# Altium footprint library con-molex.PCBLIB: 368 footprints (part 7 of 26)
Each footprint in its own frame and in the unit in brackets; x right, y up, seen from the top. Pads: shape width x height; smd on the part's side, far side on the other; paste and mask are expansions set on the pad; w line width, h text height; cw(c..) or ccw(c..) is an arc to the next point about the centre after c.
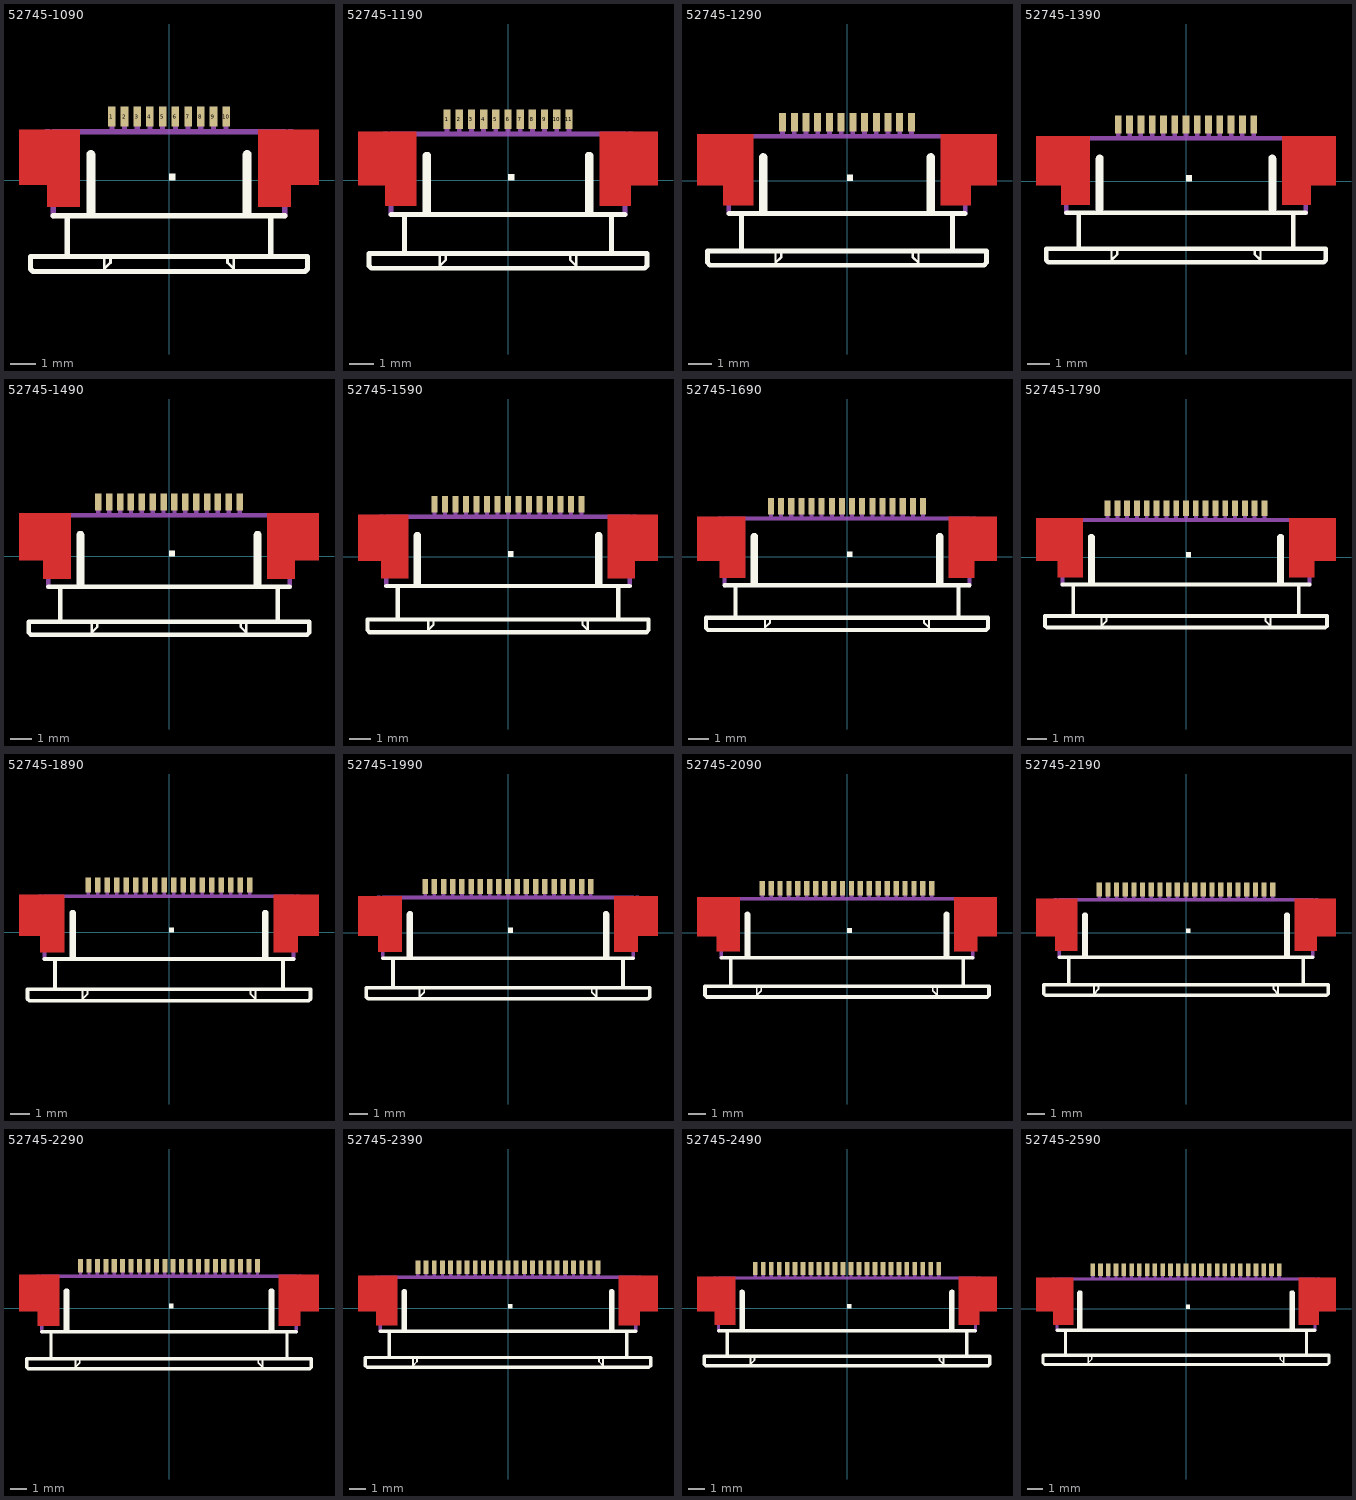
[diagram p6: the footprints below, top view; thin cyan lines are the x and y axes]

## 52745-1090 [mil]
pads (10):
  rect 11.81x31.5 smd: 1(-88.58,98.43) 2(-68.9,98.43) 3(-49.21,98.43) 4(-29.53,98.43) 5(-9.84,98.43) 6(9.84,98.43) 7(29.53,98.43) 8(49.21,98.43) 9(68.9,98.43) 10(88.58,98.43)
Top Layer:
  rectangle: -232.28,-7.87 -137.8,78.74
  rectangle: -188.98,-41.34 -137.8,-7.87
  rectangle: 137.8,-41.34 188.98,-7.87
  rectangle: 137.8,-7.87 232.28,78.74
Top Overlay:
  region: 0,0 10,0 10,10 0,10
  lines w4: -100.39,-122.05 -100.39,-137.8 -90.55,-127.95 -90.55,-122.05 ; 90.55,-122.05 90.55,-127.95 100.39,-137.8 100.39,-122.05
  lines w8: -179.13,-55.12 179.13,-55.12 ; -157.48,-114.17 -157.48,-59.06 ; -124.02,-49.21 -124.02,39.37 cw(c-121.06,39.37) -118.11,39.37 -118.11,-49.21 ; 118.11,-49.21 118.11,39.37 cw(c121.06,39.37) 124.02,39.37 124.02,-49.21 ; 157.48,-114.17 157.48,-59.06 ; -214.57,-137.8 -214.57,-118.11 214.57,-118.11 214.57,-137.8 210.63,-141.73 -210.63,-141.73 -214.57,-137.8
Top Paste:
  region: 224.41,72.83 145.67,72.83 145.67,-1.97 224.41,-1.97
  rectangle: -224.41,-1.97 -145.67,72.83
Top Solder:
  region: 232.28,78.74 187.01,78.74 187.01,-7.87 232.28,-7.87
  region: 188.98,78.74 137.8,78.74 137.8,-41.34 188.98,-41.34
  rectangle: -232.28,-7.87 -187.01,78.74
  rectangle: -188.98,-41.34 -137.8,78.74
Mechanical 16:
  rectangle: -92.52,78.74 -84.65,106.3
  rectangle: -72.83,78.74 -64.96,106.3
  rectangle: -53.15,78.74 -45.28,106.3
  rectangle: -33.46,78.74 -25.59,106.3
  rectangle: -13.78,78.74 -5.91,106.3
  rectangle: 5.91,78.74 13.78,106.3
  rectangle: 25.59,78.74 33.46,106.3
  rectangle: 45.28,78.74 53.15,106.3
  rectangle: 64.96,78.74 72.83,106.3
  rectangle: 84.65,78.74 92.52,106.3
  lines w4: -185.04,74.8 -185.04,27.56 -214.57,27.56 -214.57,35.43 -192.91,35.43 -190.94,37.4 -190.94,57.09 -214.57,57.09 -214.57,64.96 -190.94,64.96 -190.94,76.77 -185.04,76.77 ; 185.04,74.8 185.04,27.56 214.57,27.56 214.57,35.43 192.91,35.43 190.94,37.4 190.94,57.09 214.57,57.09 214.57,64.96 190.94,64.96 190.94,76.77 185.04,76.77
  lines w8: -179.13,-55.12 -179.13,74.8 179.13,74.8 179.13,-55.12

## 52745-1190 [mil]
pads (11):
  rect 11.81x31.5 smd: 1(-98.43,98.43) 2(-78.74,98.43) 3(-59.06,98.43) 4(-39.37,98.43) 5(-19.69,98.43) 6(0,98.43) 7(19.69,98.43) 8(39.37,98.43) 9(59.06,98.43) 10(78.74,98.43) 11(98.43,98.43)
Top Layer:
  rectangle: -242.13,-7.87 -147.64,78.74
  rectangle: -198.82,-41.34 -147.64,-7.87
  rectangle: 147.64,-41.34 198.82,-7.87
  rectangle: 147.64,-7.87 242.13,78.74
Top Overlay:
  region: 0,0 10,0 10,10 0,10
  lines w4: -110.24,-122.05 -110.24,-137.8 -100.39,-127.95 -100.39,-122.05 ; 100.39,-122.05 100.39,-127.95 110.24,-137.8 110.24,-122.05
  lines w8: -188.98,-55.12 188.98,-55.12 ; -167.32,-114.17 -167.32,-59.06 ; -133.86,-49.21 -133.86,39.37 cw(c-130.91,39.37) -127.95,39.37 -127.95,-49.21 ; 127.95,-49.21 127.95,39.37 cw(c130.91,39.37) 133.86,39.37 133.86,-49.21 ; 167.32,-114.17 167.32,-59.06 ; -224.41,-137.8 -224.41,-118.11 224.41,-118.11 224.41,-137.8 220.47,-141.73 -220.47,-141.73 -224.41,-137.8
Top Paste:
  region: 234.25,72.83 155.51,72.83 155.51,-1.97 234.25,-1.97
  rectangle: -234.25,-1.97 -155.51,72.83
Top Solder:
  region: 242.13,78.74 196.85,78.74 196.85,-7.87 242.13,-7.87
  region: 198.82,78.74 147.64,78.74 147.64,-41.34 198.82,-41.34
  rectangle: -242.13,-7.87 -196.85,78.74
  rectangle: -198.82,-41.34 -147.64,78.74
Mechanical 16:
  rectangle: -102.36,78.74 -94.49,106.3
  rectangle: -82.68,78.74 -74.8,106.3
  rectangle: -62.99,78.74 -55.12,106.3
  rectangle: -43.31,78.74 -35.43,106.3
  rectangle: -23.62,78.74 -15.75,106.3
  rectangle: -3.94,78.74 3.94,106.3
  rectangle: 15.75,78.74 23.62,106.3
  rectangle: 35.43,78.74 43.31,106.3
  rectangle: 55.12,78.74 62.99,106.3
  rectangle: 74.8,78.74 82.68,106.3
  rectangle: 94.49,78.74 102.36,106.3
  lines w4: -194.88,74.8 -194.88,27.56 -224.41,27.56 -224.41,35.43 -202.76,35.43 -200.79,37.4 -200.79,57.09 -224.41,57.09 -224.41,64.96 -200.79,64.96 -200.79,76.77 -194.88,76.77 ; 194.88,74.8 194.88,27.56 224.41,27.56 224.41,35.43 202.76,35.43 200.79,37.4 200.79,57.09 224.41,57.09 224.41,64.96 200.79,64.96 200.79,76.77 194.88,76.77
  lines w8: -188.98,-55.12 -188.98,74.8 188.98,74.8 188.98,-55.12

## 52745-1290 [mil]
pads (12):
  rect 11.81x31.5 smd: 1(-108.27,98.43) 2(-88.58,98.43) 3(-68.9,98.43) 4(-49.21,98.43) 5(-29.53,98.43) 6(-9.84,98.43) 7(9.84,98.43) 8(29.53,98.43) 9(49.21,98.43) 10(68.9,98.43) 11(88.58,98.43) 12(108.27,98.43)
Top Layer:
  rectangle: -251.97,-7.87 -157.48,78.74
  rectangle: -208.66,-41.34 -157.48,-7.87
  rectangle: 157.48,-7.87 251.97,78.74
  rectangle: 157.48,-41.34 208.66,-7.87
Top Overlay:
  region: 0,0 10,0 10,10 0,10
  lines w4: -120.08,-122.05 -120.08,-137.8 -110.24,-127.95 -110.24,-122.05 ; 110.24,-122.05 110.24,-127.95 120.08,-137.8 120.08,-122.05
  lines w8: -198.82,-55.12 198.82,-55.12 ; -177.17,-114.17 -177.17,-59.06 ; -143.7,-49.21 -143.7,39.37 cw(c-140.75,39.37) -137.8,39.37 -137.8,-49.21 ; 137.8,-49.21 137.8,39.37 cw(c140.75,39.37) 143.7,39.37 143.7,-49.21 ; 177.17,-114.17 177.17,-59.06 ; -234.25,-137.8 -234.25,-118.11 234.25,-118.11 234.25,-137.8 230.32,-141.73 -230.32,-141.73 -234.25,-137.8
Top Paste:
  region: 244.09,72.83 165.35,72.83 165.35,-1.97 244.09,-1.97
  rectangle: -244.09,-1.97 -165.35,72.83
Top Solder:
  region: 251.97,78.74 206.69,78.74 206.69,-7.87 251.97,-7.87
  region: 208.66,78.74 157.48,78.74 157.48,-41.34 208.66,-41.34
  rectangle: -251.97,-7.87 -206.69,78.74
  rectangle: -208.66,-41.34 -157.48,78.74
Mechanical 16:
  rectangle: -112.2,78.74 -104.33,106.3
  rectangle: -92.52,78.74 -84.65,106.3
  rectangle: -72.83,78.74 -64.96,106.3
  rectangle: -53.15,78.74 -45.28,106.3
  rectangle: -33.46,78.74 -25.59,106.3
  rectangle: -13.78,78.74 -5.91,106.3
  rectangle: 5.91,78.74 13.78,106.3
  rectangle: 25.59,78.74 33.46,106.3
  rectangle: 45.28,78.74 53.15,106.3
  rectangle: 64.96,78.74 72.83,106.3
  rectangle: 84.65,78.74 92.52,106.3
  rectangle: 104.33,78.74 112.2,106.3
  lines w4: -204.72,74.8 -204.72,27.56 -234.25,27.56 -234.25,35.43 -212.6,35.43 -210.63,37.4 -210.63,57.09 -234.25,57.09 -234.25,64.96 -210.63,64.96 -210.63,76.77 -204.72,76.77 ; 204.72,74.8 204.72,27.56 234.25,27.56 234.25,35.43 212.6,35.43 210.63,37.4 210.63,57.09 234.25,57.09 234.25,64.96 210.63,64.96 210.63,76.77 204.72,76.77
  lines w8: -198.82,-55.12 -198.82,74.8 198.82,74.8 198.82,-55.12

## 52745-1390 [mil]
pads (13):
  rect 11.81x31.5 smd: 1(-118.11,98.43) 2(-98.43,98.43) 3(-78.74,98.43) 4(-59.06,98.43) 5(-39.37,98.43) 6(-19.69,98.43) 7(0,98.43) 8(19.69,98.43) 9(39.37,98.43) 10(59.06,98.43) 11(78.74,98.43) 12(98.43,98.43) 13(118.11,98.43)
Top Layer:
  rectangle: -261.81,-7.87 -167.32,78.74
  rectangle: -218.5,-41.34 -167.32,-7.87
  rectangle: 167.32,-7.87 261.81,78.74
  rectangle: 167.32,-41.34 218.5,-7.87
Top Overlay:
  region: 0,0 10,0 10,10 0,10
  lines w4: -129.92,-122.05 -129.92,-137.8 -120.08,-127.95 -120.08,-122.05 ; 120.08,-122.05 120.08,-127.95 129.92,-137.8 129.92,-122.05
  lines w8: -208.66,-55.12 208.66,-55.12 ; -187.01,-114.17 -187.01,-59.06 ; -153.54,-49.21 -153.54,39.37 cw(c-150.59,39.37) -147.64,39.37 -147.64,-49.21 ; 147.64,-49.21 147.64,39.37 cw(c150.59,39.37) 153.54,39.37 153.54,-49.21 ; 187.01,-114.17 187.01,-59.06 ; -244.09,-137.8 -244.09,-118.11 244.09,-118.11 244.09,-137.8 240.16,-141.73 -240.16,-141.73 -244.09,-137.8
Top Paste:
  region: 253.94,72.83 175.2,72.83 175.2,-1.97 253.94,-1.97
  rectangle: -253.94,-1.97 -175.2,72.83
Top Solder:
  region: 261.81,78.74 216.54,78.74 216.54,-7.87 261.81,-7.87
  region: 218.5,78.74 167.32,78.74 167.32,-41.34 218.5,-41.34
  rectangle: -261.81,-7.87 -216.54,78.74
  rectangle: -218.5,-41.34 -167.32,78.74
Mechanical 16:
  rectangle: -122.05,78.74 -114.17,106.3
  rectangle: -102.36,78.74 -94.49,106.3
  rectangle: -82.68,78.74 -74.8,106.3
  rectangle: -62.99,78.74 -55.12,106.3
  rectangle: -43.31,78.74 -35.43,106.3
  rectangle: -23.62,78.74 -15.75,106.3
  rectangle: -3.94,78.74 3.94,106.3
  rectangle: 15.75,78.74 23.62,106.3
  rectangle: 35.43,78.74 43.31,106.3
  rectangle: 55.12,78.74 62.99,106.3
  rectangle: 74.8,78.74 82.68,106.3
  rectangle: 94.49,78.74 102.36,106.3
  rectangle: 114.17,78.74 122.05,106.3
  lines w4: -214.57,74.8 -214.57,27.56 -244.09,27.56 -244.09,35.43 -222.44,35.43 -220.47,37.4 -220.47,57.09 -244.09,57.09 -244.09,64.96 -220.47,64.96 -220.47,76.77 -214.57,76.77 ; 214.57,74.8 214.57,27.56 244.09,27.56 244.09,35.43 222.44,35.43 220.47,37.4 220.47,57.09 244.09,57.09 244.09,64.96 220.47,64.96 220.47,76.77 214.57,76.77
  lines w8: -208.66,-55.12 -208.66,74.8 208.66,74.8 208.66,-55.12

## 52745-1490 [mil]
pads (14):
  rect 11.81x31.5 smd: 1(-127.95,98.43) 2(-108.27,98.43) 3(-88.58,98.43) 4(-68.9,98.43) 5(-49.21,98.43) 6(-29.53,98.43) 7(-9.84,98.43) 8(9.84,98.43) 9(29.53,98.43) 10(49.21,98.43) 11(68.9,98.43) 12(88.58,98.43) 13(108.27,98.43) 14(127.95,98.43)
Top Layer:
  rectangle: -271.65,-7.87 -177.17,78.74
  rectangle: -228.35,-41.34 -177.17,-7.87
  rectangle: 177.17,-7.87 271.65,78.74
  rectangle: 177.17,-41.34 228.35,-7.87
Top Overlay:
  region: 0,0 10,0 10,10 0,10
  lines w4: -139.76,-122.05 -139.76,-137.8 -129.92,-127.95 -129.92,-122.05 ; 129.92,-122.05 129.92,-127.95 139.76,-137.8 139.76,-122.05
  lines w8: -218.5,-55.12 218.5,-55.12 ; -196.85,-114.17 -196.85,-59.06 ; -163.39,-49.21 -163.39,39.37 cw(c-160.44,39.37) -157.48,39.37 -157.48,-49.21 ; 157.48,-49.21 157.48,39.37 cw(c160.44,39.37) 163.39,39.37 163.39,-49.21 ; 196.85,-114.17 196.85,-59.06 ; -253.94,-137.8 -253.94,-118.11 253.94,-118.11 253.94,-137.8 250,-141.73 -250,-141.73 -253.94,-137.8
Top Paste:
  region: 263.78,72.83 185.04,72.83 185.04,-1.97 263.78,-1.97
  rectangle: -263.78,-1.97 -185.04,72.83
Top Solder:
  region: 271.65,78.74 226.38,78.74 226.38,-7.87 271.65,-7.87
  region: 228.35,78.74 177.17,78.74 177.17,-41.34 228.35,-41.34
  rectangle: -271.65,-7.87 -226.38,78.74
  rectangle: -228.35,-41.34 -177.17,78.74
Mechanical 16:
  rectangle: -131.89,78.74 -124.02,106.3
  rectangle: -112.2,78.74 -104.33,106.3
  rectangle: -92.52,78.74 -84.65,106.3
  rectangle: -72.83,78.74 -64.96,106.3
  rectangle: -53.15,78.74 -45.28,106.3
  rectangle: -33.46,78.74 -25.59,106.3
  rectangle: -13.78,78.74 -5.91,106.3
  rectangle: 5.91,78.74 13.78,106.3
  rectangle: 25.59,78.74 33.46,106.3
  rectangle: 45.28,78.74 53.15,106.3
  rectangle: 64.96,78.74 72.83,106.3
  rectangle: 84.65,78.74 92.52,106.3
  rectangle: 104.33,78.74 112.2,106.3
  rectangle: 124.02,78.74 131.89,106.3
  lines w4: -224.41,74.8 -224.41,27.56 -253.94,27.56 -253.94,35.43 -232.28,35.43 -230.32,37.4 -230.32,57.09 -253.94,57.09 -253.94,64.96 -230.32,64.96 -230.32,76.77 -224.41,76.77 ; 224.41,74.8 224.41,27.56 253.94,27.56 253.94,35.43 232.28,35.43 230.32,37.4 230.32,57.09 253.94,57.09 253.94,64.96 230.32,64.96 230.32,76.77 224.41,76.77
  lines w8: -218.5,-55.12 -218.5,74.8 218.5,74.8 218.5,-55.12

## 52745-1590 [mil]
pads (15):
  rect 11.81x31.5 smd: 1(-137.8,98.43) 2(-118.11,98.43) 3(-98.43,98.43) 4(-78.74,98.43) 5(-59.06,98.43) 6(-39.37,98.43) 7(-19.69,98.43) 8(0,98.43) 9(19.69,98.43) 10(39.37,98.43) 11(59.06,98.43) 12(78.74,98.43) 13(98.43,98.43) 14(118.11,98.43) 15(137.8,98.43)
Top Layer:
  rectangle: -281.5,-7.87 -187.01,78.74
  rectangle: -238.19,-41.34 -187.01,-7.87
  rectangle: 187.01,-7.87 281.5,78.74
  rectangle: 187.01,-41.34 238.19,-7.87
Top Overlay:
  region: 0,0 10,0 10,10 0,10
  lines w4: -149.61,-122.05 -149.61,-137.8 -139.76,-127.95 -139.76,-122.05 ; 139.76,-122.05 139.76,-127.95 149.61,-137.8 149.61,-122.05
  lines w8: -228.35,-55.12 228.35,-55.12 ; -206.69,-114.17 -206.69,-59.06 ; -173.23,-49.21 -173.23,39.37 cw(c-170.28,39.37) -167.32,39.37 -167.32,-49.21 ; 167.32,-49.21 167.32,39.37 cw(c170.28,39.37) 173.23,39.37 173.23,-49.21 ; 206.69,-114.17 206.69,-59.06 ; -263.78,-137.8 -263.78,-118.11 263.78,-118.11 263.78,-137.8 259.84,-141.73 -259.84,-141.73 -263.78,-137.8
Top Paste:
  region: 273.62,72.83 194.88,72.83 194.88,-1.97 273.62,-1.97
  rectangle: -273.62,-1.97 -194.88,72.83
Top Solder:
  region: 281.5,78.74 236.22,78.74 236.22,-7.87 281.5,-7.87
  region: 238.19,78.74 187.01,78.74 187.01,-41.34 238.19,-41.34
  rectangle: -281.5,-7.87 -236.22,78.74
  rectangle: -238.19,-41.34 -187.01,78.74
Mechanical 16:
  rectangle: -141.73,78.74 -133.86,106.3
  rectangle: -122.05,78.74 -114.17,106.3
  rectangle: -102.36,78.74 -94.49,106.3
  rectangle: -82.68,78.74 -74.8,106.3
  rectangle: -62.99,78.74 -55.12,106.3
  rectangle: -43.31,78.74 -35.43,106.3
  rectangle: -23.62,78.74 -15.75,106.3
  rectangle: -3.94,78.74 3.94,106.3
  rectangle: 15.75,78.74 23.62,106.3
  rectangle: 35.43,78.74 43.31,106.3
  rectangle: 55.12,78.74 62.99,106.3
  rectangle: 74.8,78.74 82.68,106.3
  rectangle: 94.49,78.74 102.36,106.3
  rectangle: 114.17,78.74 122.05,106.3
  rectangle: 133.86,78.74 141.73,106.3
  lines w4: -234.25,74.8 -234.25,27.56 -263.78,27.56 -263.78,35.43 -242.13,35.43 -240.16,37.4 -240.16,57.09 -263.78,57.09 -263.78,64.96 -240.16,64.96 -240.16,76.77 -234.25,76.77 ; 234.25,74.8 234.25,27.56 263.78,27.56 263.78,35.43 242.13,35.43 240.16,37.4 240.16,57.09 263.78,57.09 263.78,64.96 240.16,64.96 240.16,76.77 234.25,76.77
  lines w8: -228.35,-55.12 -228.35,74.8 228.35,74.8 228.35,-55.12

## 52745-1690 [mil]
pads (16):
  rect 11.81x31.5 smd: 1(-147.64,98.43) 2(-127.95,98.43) 3(-108.27,98.43) 4(-88.58,98.43) 5(-68.9,98.43) 6(-49.21,98.43) 7(-29.53,98.43) 8(-9.84,98.43) 9(9.84,98.43) 10(29.53,98.43) 11(49.21,98.43) 12(68.9,98.43) 13(88.58,98.43) 14(108.27,98.43) 15(127.95,98.43) 16(147.64,98.43)
Top Layer:
  rectangle: -291.34,-7.87 -196.85,78.74
  rectangle: -248.03,-41.34 -196.85,-7.87
  rectangle: 196.85,-7.87 291.34,78.74
  rectangle: 196.85,-41.34 248.03,-7.87
Top Overlay:
  region: 0,0 10,0 10,10 0,10
  lines w4: -159.45,-122.05 -159.45,-137.8 -149.61,-127.95 -149.61,-122.05 ; 149.61,-122.05 149.61,-127.95 159.45,-137.8 159.45,-122.05
  lines w8: -238.19,-55.12 238.19,-55.12 ; -216.54,-114.17 -216.54,-59.06 ; -183.07,-49.21 -183.07,39.37 cw(c-180.12,39.37) -177.17,39.37 -177.17,-49.21 ; 177.17,-49.21 177.17,39.37 cw(c180.12,39.37) 183.07,39.37 183.07,-49.21 ; 216.54,-114.17 216.54,-59.06 ; -273.62,-137.8 -273.62,-118.11 273.62,-118.11 273.62,-137.8 269.69,-141.73 -269.69,-141.73 -273.62,-137.8
Top Paste:
  region: 283.46,72.83 204.72,72.83 204.72,-1.97 283.46,-1.97
  rectangle: -283.46,-1.97 -204.72,72.83
Top Solder:
  region: 291.34,78.74 246.06,78.74 246.06,-7.87 291.34,-7.87
  region: 248.03,78.74 196.85,78.74 196.85,-41.34 248.03,-41.34
  rectangle: -291.34,-7.87 -246.06,78.74
  rectangle: -248.03,-41.34 -196.85,78.74
Mechanical 16:
  rectangle: -151.57,78.74 -143.7,106.3
  rectangle: -131.89,78.74 -124.02,106.3
  rectangle: -112.2,78.74 -104.33,106.3
  rectangle: -92.52,78.74 -84.65,106.3
  rectangle: -72.83,78.74 -64.96,106.3
  rectangle: -53.15,78.74 -45.28,106.3
  rectangle: -33.46,78.74 -25.59,106.3
  rectangle: -13.78,78.74 -5.91,106.3
  rectangle: 5.91,78.74 13.78,106.3
  rectangle: 25.59,78.74 33.46,106.3
  rectangle: 45.28,78.74 53.15,106.3
  rectangle: 64.96,78.74 72.83,106.3
  rectangle: 84.65,78.74 92.52,106.3
  rectangle: 104.33,78.74 112.2,106.3
  rectangle: 124.02,78.74 131.89,106.3
  rectangle: 143.7,78.74 151.57,106.3
  lines w4: -244.09,74.8 -244.09,27.56 -273.62,27.56 -273.62,35.43 -251.97,35.43 -250,37.4 -250,57.09 -273.62,57.09 -273.62,64.96 -250,64.96 -250,76.77 -244.09,76.77 ; 244.09,74.8 244.09,27.56 273.62,27.56 273.62,35.43 251.97,35.43 250,37.4 250,57.09 273.62,57.09 273.62,64.96 250,64.96 250,76.77 244.09,76.77
  lines w8: -238.19,-55.12 -238.19,74.8 238.19,74.8 238.19,-55.12

## 52745-1790 [mil]
pads (17):
  rect 11.81x31.5 smd: 1(-157.48,98.43) 2(-137.8,98.43) 3(-118.11,98.43) 4(-98.43,98.43) 5(-78.74,98.43) 6(-59.06,98.43) 7(-39.37,98.43) 8(-19.69,98.43) 9(0,98.43) 10(19.69,98.43) 11(39.37,98.43) 12(59.06,98.43) 13(78.74,98.43) 14(98.43,98.43) 15(118.11,98.43) 16(137.8,98.43) 17(157.48,98.43)
Top Layer:
  rectangle: -301.18,-7.87 -206.69,78.74
  rectangle: -257.87,-41.34 -206.69,-6.89
  rectangle: 206.69,-41.34 257.87,-6.89
  rectangle: 206.69,-7.87 301.18,78.74
Top Overlay:
  region: 0,0 10,0 10,10 0,10
  lines w4: -169.29,-122.05 -169.29,-137.8 -159.45,-127.95 -159.45,-122.05 ; 159.45,-122.05 159.45,-127.95 169.29,-137.8 169.29,-122.05
  lines w8: -248.03,-55.12 248.03,-55.12 ; -226.38,-114.17 -226.38,-59.06 ; -192.91,-49.21 -192.91,39.37 cw(c-189.96,39.37) -187.01,39.37 -187.01,-49.21 ; 187.01,-49.21 187.01,39.37 cw(c189.96,39.37) 192.91,39.37 192.91,-49.21 ; 226.38,-114.17 226.38,-59.06 ; -283.46,-137.8 -283.46,-118.11 283.46,-118.11 283.46,-137.8 279.53,-141.73 -279.53,-141.73 -283.46,-137.8
Top Paste:
  region: 293.31,72.83 214.57,72.83 214.57,-1.97 293.31,-1.97
  rectangle: -293.31,-1.97 -214.57,72.83
Top Solder:
  region: 301.18,78.74 255.91,78.74 255.91,-7.87 301.18,-7.87
  region: 257.87,78.74 206.69,78.74 206.69,-41.34 257.87,-41.34
  rectangle: -301.18,-7.87 -255.91,78.74
  rectangle: -257.87,-41.34 -206.69,78.74
Mechanical 16:
  rectangle: -161.42,78.74 -153.54,106.3
  rectangle: -141.73,78.74 -133.86,106.3
  rectangle: -122.05,78.74 -114.17,106.3
  rectangle: -102.36,78.74 -94.49,106.3
  rectangle: -82.68,78.74 -74.8,106.3
  rectangle: -62.99,78.74 -55.12,106.3
  rectangle: -43.31,78.74 -35.43,106.3
  rectangle: -23.62,78.74 -15.75,106.3
  rectangle: -3.94,78.74 3.94,106.3
  rectangle: 15.75,78.74 23.62,106.3
  rectangle: 35.43,78.74 43.31,106.3
  rectangle: 55.12,78.74 62.99,106.3
  rectangle: 74.8,78.74 82.68,106.3
  rectangle: 94.49,78.74 102.36,106.3
  rectangle: 114.17,78.74 122.05,106.3
  rectangle: 133.86,78.74 141.73,106.3
  rectangle: 153.54,78.74 161.42,106.3
  lines w4: -253.94,74.8 -253.94,27.56 -283.46,27.56 -283.46,35.43 -261.81,35.43 -259.84,37.4 -259.84,57.09 -283.46,57.09 -283.46,64.96 -259.84,64.96 -259.84,76.77 -253.94,76.77 ; 253.94,74.8 253.94,27.56 283.46,27.56 283.46,35.43 261.81,35.43 259.84,37.4 259.84,57.09 283.46,57.09 283.46,64.96 259.84,64.96 259.84,76.77 253.94,76.77
  lines w8: -248.03,-55.12 -248.03,74.8 248.03,74.8 248.03,-55.12

## 52745-1890 [mil]
pads (18):
  rect 11.81x31.5 smd: 1(-167.32,98.43) 2(-147.64,98.43) 3(-127.95,98.43) 4(-108.27,98.43) 5(-88.58,98.43) 6(-68.9,98.43) 7(-49.21,98.43) 8(-29.53,98.43) 9(-9.84,98.43) 10(9.84,98.43) 11(29.53,98.43) 12(49.21,98.43) 13(68.9,98.43) 14(88.58,98.43) 15(108.27,98.43) 16(127.95,98.43) 17(147.64,98.43) 18(167.32,98.43)
Top Layer:
  rectangle: -311.02,-7.87 -216.54,78.74
  rectangle: -267.72,-41.34 -216.54,-7.87
  rectangle: 216.54,-41.34 267.72,-7.87
  rectangle: 216.54,-7.87 311.02,78.74
Top Overlay:
  region: 0,0 10,0 10,10 0,10
  lines w4: -179.13,-122.05 -179.13,-137.8 -169.29,-127.95 -169.29,-122.05 ; 169.29,-122.05 169.29,-127.95 179.13,-137.8 179.13,-122.05
  lines w8: -257.87,-55.12 257.87,-55.12 ; -236.22,-114.17 -236.22,-59.06 ; -202.76,-49.21 -202.76,39.37 cw(c-199.81,39.37) -196.85,39.37 -196.85,-49.21 ; 196.85,-49.21 196.85,39.37 cw(c199.81,39.37) 202.76,39.37 202.76,-49.21 ; 236.22,-114.17 236.22,-59.06 ; -293.31,-137.8 -293.31,-118.11 293.31,-118.11 293.31,-137.8 289.37,-141.73 -289.37,-141.73 -293.31,-137.8
Top Paste:
  region: 303.15,72.83 224.41,72.83 224.41,-1.97 303.15,-1.97
  rectangle: -303.15,-1.97 -224.41,72.83
Top Solder:
  region: 311.02,78.74 265.75,78.74 265.75,-7.87 311.02,-7.87
  region: 267.72,78.74 216.54,78.74 216.54,-41.34 267.72,-41.34
  rectangle: -311.02,-7.87 -265.75,78.74
  rectangle: -267.72,-41.34 -216.54,78.74
Mechanical 16:
  rectangle: -171.26,78.74 -163.39,106.3
  rectangle: -151.57,78.74 -143.7,106.3
  rectangle: -131.89,78.74 -124.02,106.3
  rectangle: -112.2,78.74 -104.33,106.3
  rectangle: -92.52,78.74 -84.65,106.3
  rectangle: -72.83,78.74 -64.96,106.3
  rectangle: -53.15,78.74 -45.28,106.3
  rectangle: -33.46,78.74 -25.59,106.3
  rectangle: -13.78,78.74 -5.91,106.3
  rectangle: 5.91,78.74 13.78,106.3
  rectangle: 25.59,78.74 33.46,106.3
  rectangle: 45.28,78.74 53.15,106.3
  rectangle: 64.96,78.74 72.83,106.3
  rectangle: 84.65,78.74 92.52,106.3
  rectangle: 104.33,78.74 112.2,106.3
  rectangle: 124.02,78.74 131.89,106.3
  rectangle: 143.7,78.74 151.57,106.3
  rectangle: 163.39,78.74 171.26,106.3
  lines w4: -263.78,74.8 -263.78,27.56 -293.31,27.56 -293.31,35.43 -271.65,35.43 -269.69,37.4 -269.69,57.09 -293.31,57.09 -293.31,64.96 -269.69,64.96 -269.69,76.77 -263.78,76.77 ; 263.78,74.8 263.78,27.56 293.31,27.56 293.31,35.43 271.65,35.43 269.69,37.4 269.69,57.09 293.31,57.09 293.31,64.96 269.69,64.96 269.69,76.77 263.78,76.77
  lines w8: -257.87,-55.12 -257.87,74.8 257.87,74.8 257.87,-55.12

## 52745-1990 [mil]
pads (19):
  rect 11.81x31.5 smd: 1(-177.17,98.43) 2(-157.48,98.43) 3(-137.8,98.43) 4(-118.11,98.43) 5(-98.43,98.43) 6(-78.74,98.43) 7(-59.06,98.43) 8(-39.37,98.43) 9(-19.69,98.43) 10(0,98.43) 11(19.69,98.43) 12(39.37,98.43) 13(59.06,98.43) 14(78.74,98.43) 15(98.43,98.43) 16(118.11,98.43) 17(137.8,98.43) 18(157.48,98.43) 19(177.17,98.43)
Top Layer:
  rectangle: -320.87,-7.87 -226.38,78.74
  rectangle: -277.56,-41.34 -226.38,-7.87
  rectangle: 226.38,-41.34 277.56,-7.87
  rectangle: 226.38,-7.87 320.87,78.74
Top Overlay:
  region: 0,0 10,0 10,10 0,10
  lines w4: -188.98,-122.05 -188.98,-137.8 -179.13,-127.95 -179.13,-122.05 ; 179.13,-122.05 179.13,-127.95 188.98,-137.8 188.98,-122.05
  lines w8: -267.72,-55.12 267.72,-55.12 ; -246.06,-114.17 -246.06,-59.06 ; -212.6,-49.21 -212.6,39.37 cw(c-209.65,39.37) -206.69,39.37 -206.69,-49.21 ; 206.69,-49.21 206.69,39.37 cw(c209.65,39.37) 212.6,39.37 212.6,-49.21 ; 246.06,-114.17 246.06,-59.06 ; -303.15,-137.8 -303.15,-118.11 303.15,-118.11 303.15,-137.8 299.21,-141.73 -299.21,-141.73 -303.15,-137.8
Top Paste:
  region: 312.99,72.83 234.25,72.83 234.25,-1.97 312.99,-1.97
  rectangle: -312.99,-1.97 -234.25,72.83
Top Solder:
  region: 320.87,78.74 275.59,78.74 275.59,-7.87 320.87,-7.87
  region: 277.56,78.74 226.38,78.74 226.38,-41.34 277.56,-41.34
  rectangle: -320.87,-7.87 -275.59,78.74
  rectangle: -277.56,-41.34 -226.38,78.74
Mechanical 16:
  rectangle: -181.1,78.74 -173.23,106.3
  rectangle: -161.42,78.74 -153.54,106.3
  rectangle: -141.73,78.74 -133.86,106.3
  rectangle: -122.05,78.74 -114.17,106.3
  rectangle: -102.36,78.74 -94.49,106.3
  rectangle: -82.68,78.74 -74.8,106.3
  rectangle: -62.99,78.74 -55.12,106.3
  rectangle: -43.31,78.74 -35.43,106.3
  rectangle: -23.62,78.74 -15.75,106.3
  rectangle: -3.94,78.74 3.94,106.3
  rectangle: 15.75,78.74 23.62,106.3
  rectangle: 35.43,78.74 43.31,106.3
  rectangle: 55.12,78.74 62.99,106.3
  rectangle: 74.8,78.74 82.68,106.3
  rectangle: 94.49,78.74 102.36,106.3
  rectangle: 114.17,78.74 122.05,106.3
  rectangle: 133.86,78.74 141.73,106.3
  rectangle: 153.54,78.74 161.42,106.3
  rectangle: 173.23,78.74 181.1,106.3
  lines w4: -273.62,74.8 -273.62,27.56 -303.15,27.56 -303.15,35.43 -281.5,35.43 -279.53,37.4 -279.53,57.09 -303.15,57.09 -303.15,64.96 -279.53,64.96 -279.53,76.77 -273.62,76.77 ; 273.62,74.8 273.62,27.56 303.15,27.56 303.15,35.43 281.5,35.43 279.53,37.4 279.53,57.09 303.15,57.09 303.15,64.96 279.53,64.96 279.53,76.77 273.62,76.77
  lines w8: -267.72,-55.12 -267.72,74.8 267.72,74.8 267.72,-55.12

## 52745-2090 [mil]
pads (20):
  rect 11.81x31.5 smd: 1(-187.01,98.43) 2(-167.32,98.43) 3(-147.64,98.43) 4(-127.95,98.43) 5(-108.27,98.43) 6(-88.58,98.43) 7(-68.9,98.43) 8(-49.21,98.43) 9(-29.53,98.43) 10(-9.84,98.43) 11(9.84,98.43) 12(29.53,98.43) 13(49.21,98.43) 14(68.9,98.43) 15(88.58,98.43) 16(108.27,98.43) 17(127.95,98.43) 18(147.64,98.43) 19(167.32,98.43) 20(187.01,98.43)
Top Layer:
  rectangle: -330.71,-7.87 -236.22,78.74
  rectangle: -287.4,-41.34 -236.22,-7.87
  rectangle: 236.22,-41.34 287.4,-7.87
  rectangle: 236.22,-7.87 330.71,78.74
Top Overlay:
  region: 0,0 10,0 10,10 0,10
  lines w4: -198.82,-122.05 -198.82,-137.8 -188.98,-127.95 -188.98,-122.05 ; 188.98,-122.05 188.98,-127.95 198.82,-137.8 198.82,-122.05
  lines w8: -277.56,-55.12 277.56,-55.12 ; -255.91,-114.17 -255.91,-59.06 ; -222.44,-49.21 -222.44,39.37 cw(c-219.49,39.37) -216.54,39.37 -216.54,-49.21 ; 216.54,-49.21 216.54,39.37 cw(c219.49,39.37) 222.44,39.37 222.44,-49.21 ; 255.91,-114.17 255.91,-59.06 ; -312.99,-137.8 -312.99,-118.11 312.99,-118.11 312.99,-137.8 309.06,-141.73 -309.06,-141.73 -312.99,-137.8
Top Paste:
  region: 322.83,72.83 244.09,72.83 244.09,-1.97 322.83,-1.97
  rectangle: -322.83,-1.97 -244.09,72.83
Top Solder:
  region: 330.71,78.74 285.43,78.74 285.43,-7.87 330.71,-7.87
  region: 287.4,78.74 236.22,78.74 236.22,-41.34 287.4,-41.34
  rectangle: -330.71,-7.87 -285.43,78.74
  rectangle: -287.4,-41.34 -236.22,78.74
Mechanical 16:
  rectangle: -190.94,78.74 -183.07,106.3
  rectangle: -171.26,78.74 -163.39,106.3
  rectangle: -151.57,78.74 -143.7,106.3
  rectangle: -131.89,78.74 -124.02,106.3
  rectangle: -112.2,78.74 -104.33,106.3
  rectangle: -92.52,78.74 -84.65,106.3
  rectangle: -72.83,78.74 -64.96,106.3
  rectangle: -53.15,78.74 -45.28,106.3
  rectangle: -33.46,78.74 -25.59,106.3
  rectangle: -13.78,78.74 -5.91,106.3
  rectangle: 5.91,78.74 13.78,106.3
  rectangle: 25.59,78.74 33.46,106.3
  rectangle: 45.28,78.74 53.15,106.3
  rectangle: 64.96,78.74 72.83,106.3
  rectangle: 84.65,78.74 92.52,106.3
  rectangle: 104.33,78.74 112.2,106.3
  rectangle: 124.02,78.74 131.89,106.3
  rectangle: 143.7,78.74 151.57,106.3
  rectangle: 163.39,78.74 171.26,106.3
  rectangle: 183.07,78.74 190.94,106.3
  lines w4: -283.46,74.8 -283.46,27.56 -312.99,27.56 -312.99,35.43 -291.34,35.43 -289.37,37.4 -289.37,57.09 -312.99,57.09 -312.99,64.96 -289.37,64.96 -289.37,76.77 -283.46,76.77 ; 283.46,74.8 283.46,27.56 312.99,27.56 312.99,35.43 291.34,35.43 289.37,37.4 289.37,57.09 312.99,57.09 312.99,64.96 289.37,64.96 289.37,76.77 283.46,76.77
  lines w8: -277.56,-55.12 -277.56,74.8 277.56,74.8 277.56,-55.12

## 52745-2190 [mil]
pads (21):
  rect 11.81x31.5 smd: 1(-196.85,98.43) 2(-177.17,98.43) 3(-157.48,98.43) 4(-137.8,98.43) 5(-118.11,98.43) 6(-98.43,98.43) 7(-78.74,98.43) 8(-59.06,98.43) 9(-39.37,98.43) 10(-19.69,98.43) 11(0,98.43) 12(19.69,98.43) 13(39.37,98.43) 14(59.06,98.43) 15(78.74,98.43) 16(98.43,98.43) 17(118.11,98.43) 18(137.8,98.43) 19(157.48,98.43) 20(177.17,98.43) 21(196.85,98.43)
Top Layer:
  rectangle: -340.55,-7.87 -246.06,78.74
  rectangle: -297.24,-41.34 -246.06,-7.87
  rectangle: 246.06,-41.34 297.24,-7.87
  rectangle: 246.06,-7.87 340.55,78.74
Top Overlay:
  region: 0,0 10,0 10,10 0,10
  lines w4: -208.66,-122.05 -208.66,-137.8 -198.82,-127.95 -198.82,-122.05 ; 198.82,-122.05 198.82,-127.95 208.66,-137.8 208.66,-122.05
  lines w8: -287.4,-55.12 287.4,-55.12 ; -265.75,-114.17 -265.75,-59.06 ; -232.28,-49.21 -232.28,39.37 cw(c-229.33,39.37) -226.38,39.37 -226.38,-49.21 ; 226.38,-49.21 226.38,39.37 cw(c229.33,39.37) 232.28,39.37 232.28,-49.21 ; 265.75,-114.17 265.75,-59.06 ; -322.83,-137.8 -322.83,-118.11 322.83,-118.11 322.83,-137.8 318.9,-141.73 -318.9,-141.73 -322.83,-137.8
Top Paste:
  region: 332.68,72.83 253.94,72.83 253.94,-1.97 332.68,-1.97
  rectangle: -332.68,-1.97 -253.94,72.83
Top Solder:
  region: 340.55,78.74 295.28,78.74 295.28,-7.87 340.55,-7.87
  region: 297.24,78.74 246.06,78.74 246.06,-41.34 297.24,-41.34
  rectangle: -340.55,-7.87 -295.28,78.74
  rectangle: -297.24,-41.34 -246.06,78.74
Mechanical 16:
  rectangle: -200.79,78.74 -192.91,106.3
  rectangle: -181.1,78.74 -173.23,106.3
  rectangle: -161.42,78.74 -153.54,106.3
  rectangle: -141.73,78.74 -133.86,106.3
  rectangle: -122.05,78.74 -114.17,106.3
  rectangle: -102.36,78.74 -94.49,106.3
  rectangle: -82.68,78.74 -74.8,106.3
  rectangle: -62.99,78.74 -55.12,106.3
  rectangle: -43.31,78.74 -35.43,106.3
  rectangle: -23.62,78.74 -15.75,106.3
  rectangle: -3.94,78.74 3.94,106.3
  rectangle: 15.75,78.74 23.62,106.3
  rectangle: 35.43,78.74 43.31,106.3
  rectangle: 55.12,78.74 62.99,106.3
  rectangle: 74.8,78.74 82.68,106.3
  rectangle: 94.49,78.74 102.36,106.3
  rectangle: 114.17,78.74 122.05,106.3
  rectangle: 133.86,78.74 141.73,106.3
  rectangle: 153.54,78.74 161.42,106.3
  rectangle: 173.23,78.74 181.1,106.3
  rectangle: 192.91,78.74 200.79,106.3
  lines w4: -293.31,74.8 -293.31,27.56 -322.83,27.56 -322.83,35.43 -301.18,35.43 -299.21,37.4 -299.21,57.09 -322.83,57.09 -322.83,64.96 -299.21,64.96 -299.21,76.77 -293.31,76.77 ; 293.31,74.8 293.31,27.56 322.83,27.56 322.83,35.43 301.18,35.43 299.21,37.4 299.21,57.09 322.83,57.09 322.83,64.96 299.21,64.96 299.21,76.77 293.31,76.77
  lines w8: -287.4,-55.12 -287.4,74.8 287.4,74.8 287.4,-55.12

## 52745-2290 [mil]
pads (22):
  rect 11.81x31.5 smd: 1(-206.69,98.43) 2(-187.01,98.43) 3(-167.32,98.43) 4(-147.64,98.43) 5(-127.95,98.43) 6(-108.27,98.43) 7(-88.58,98.43) 8(-68.9,98.43) 9(-49.21,98.43) 10(-29.53,98.43) 11(-9.84,98.43) 12(9.84,98.43) 13(29.53,98.43) 14(49.21,98.43) 15(68.9,98.43) 16(88.58,98.43) 17(108.27,98.43) 18(127.95,98.43) 19(147.64,98.43) 20(167.32,98.43) 21(187.01,98.43) 22(206.69,98.43)
Top Layer:
  rectangle: -350.39,-7.87 -255.91,78.74
  rectangle: -307.09,-41.34 -255.91,-7.87
  rectangle: 255.91,-41.34 307.09,-7.87
  rectangle: 255.91,-7.87 350.39,78.74
Top Overlay:
  region: 0,0 10,0 10,10 0,10
  lines w4: -218.5,-122.05 -218.5,-137.8 -208.66,-127.95 -208.66,-122.05 ; 208.66,-122.05 208.66,-127.95 218.5,-137.8 218.5,-122.05
  lines w8: -297.24,-55.12 297.24,-55.12 ; -275.59,-114.17 -275.59,-59.06 ; -242.13,-49.21 -242.13,39.37 cw(c-239.18,39.37) -236.22,39.37 -236.22,-49.21 ; 236.22,-49.21 236.22,39.37 cw(c239.18,39.37) 242.13,39.37 242.13,-49.21 ; 275.59,-114.17 275.59,-59.06 ; -332.68,-137.8 -332.68,-118.11 332.68,-118.11 332.68,-137.8 328.74,-141.73 -328.74,-141.73 -332.68,-137.8
Top Paste:
  region: 342.52,72.83 263.78,72.83 263.78,-1.97 342.52,-1.97
  rectangle: -342.52,-1.97 -263.78,72.83
Top Solder:
  region: 350.39,78.74 305.12,78.74 305.12,-7.87 350.39,-7.87
  region: 307.09,78.74 255.91,78.74 255.91,-41.34 307.09,-41.34
  rectangle: -350.39,-7.87 -305.12,78.74
  rectangle: -307.09,-41.34 -255.91,78.74
Mechanical 16:
  rectangle: -210.63,78.74 -202.76,106.3
  rectangle: -190.94,78.74 -183.07,106.3
  rectangle: -171.26,78.74 -163.39,106.3
  rectangle: -151.57,78.74 -143.7,106.3
  rectangle: -131.89,78.74 -124.02,106.3
  rectangle: -112.2,78.74 -104.33,106.3
  rectangle: -92.52,78.74 -84.65,106.3
  rectangle: -72.83,78.74 -64.96,106.3
  rectangle: -53.15,78.74 -45.28,106.3
  rectangle: -33.46,78.74 -25.59,106.3
  rectangle: -13.78,78.74 -5.91,106.3
  rectangle: 5.91,78.74 13.78,106.3
  rectangle: 25.59,78.74 33.46,106.3
  rectangle: 45.28,78.74 53.15,106.3
  rectangle: 64.96,78.74 72.83,106.3
  rectangle: 84.65,78.74 92.52,106.3
  rectangle: 104.33,78.74 112.2,106.3
  rectangle: 124.02,78.74 131.89,106.3
  rectangle: 143.7,78.74 151.57,106.3
  rectangle: 163.39,78.74 171.26,106.3
  rectangle: 183.07,78.74 190.94,106.3
  rectangle: 202.76,78.74 210.63,106.3
  lines w4: -303.15,74.8 -303.15,27.56 -332.68,27.56 -332.68,35.43 -311.02,35.43 -309.06,37.4 -309.06,57.09 -332.68,57.09 -332.68,64.96 -309.06,64.96 -309.06,76.77 -303.15,76.77 ; 303.15,74.8 303.15,27.56 332.68,27.56 332.68,35.43 311.02,35.43 309.06,37.4 309.06,57.09 332.68,57.09 332.68,64.96 309.06,64.96 309.06,76.77 303.15,76.77
  lines w8: -297.24,-55.12 -297.24,74.8 297.24,74.8 297.24,-55.12

## 52745-2390 [mil]
pads (23):
  rect 11.81x31.5 smd: 1(-216.54,98.43) 2(-196.85,98.43) 3(-177.17,98.43) 4(-157.48,98.43) 5(-137.8,98.43) 6(-118.11,98.43) 7(-98.43,98.43) 8(-78.74,98.43) 9(-59.06,98.43) 10(-39.37,98.43) 11(-19.69,98.43) 12(0,98.43) 13(19.69,98.43) 14(39.37,98.43) 15(59.06,98.43) 16(78.74,98.43) 17(98.43,98.43) 18(118.11,98.43) 19(137.8,98.43) 20(157.48,98.43) 21(177.17,98.43) 22(196.85,98.43) 23(216.54,98.43)
Top Layer:
  rectangle: -360.24,-7.87 -265.75,78.74
  rectangle: -316.93,-41.34 -265.75,-7.87
  rectangle: 265.75,-41.34 316.93,-7.87
  rectangle: 265.75,-7.87 360.24,78.74
Top Overlay:
  region: 0,0 10,0 10,10 0,10
  lines w4: -228.35,-122.05 -228.35,-137.8 -218.5,-127.95 -218.5,-122.05 ; 218.5,-122.05 218.5,-127.95 228.35,-137.8 228.35,-122.05
  lines w8: -307.09,-55.12 307.09,-55.12 ; -285.43,-114.17 -285.43,-59.06 ; -251.97,-49.21 -251.97,39.37 cw(c-249.01,39.37) -246.06,39.37 -246.06,-49.21 ; 246.06,-49.21 246.06,39.37 cw(c249.01,39.37) 251.97,39.37 251.97,-49.21 ; 285.43,-114.17 285.43,-59.06 ; -342.52,-137.8 -342.52,-118.11 342.52,-118.11 342.52,-137.8 338.58,-141.73 -338.58,-141.73 -342.52,-137.8
Top Paste:
  region: 352.36,72.83 273.62,72.83 273.62,-1.97 352.36,-1.97
  rectangle: -352.36,-1.97 -273.62,72.83
Top Solder:
  region: 360.24,78.74 314.96,78.74 314.96,-7.87 360.24,-7.87
  region: 316.93,78.74 265.75,78.74 265.75,-41.34 316.93,-41.34
  rectangle: -360.24,-7.87 -314.96,78.74
  rectangle: -316.93,-41.34 -265.75,78.74
Mechanical 16:
  rectangle: -220.47,78.74 -212.6,106.3
  rectangle: -200.79,78.74 -192.91,106.3
  rectangle: -181.1,78.74 -173.23,106.3
  rectangle: -161.42,78.74 -153.54,106.3
  rectangle: -141.73,78.74 -133.86,106.3
  rectangle: -122.05,78.74 -114.17,106.3
  rectangle: -102.36,78.74 -94.49,106.3
  rectangle: -82.68,78.74 -74.8,106.3
  rectangle: -62.99,78.74 -55.12,106.3
  rectangle: -43.31,78.74 -35.43,106.3
  rectangle: -23.62,78.74 -15.75,106.3
  rectangle: -3.94,78.74 3.94,106.3
  rectangle: 15.75,78.74 23.62,106.3
  rectangle: 35.43,78.74 43.31,106.3
  rectangle: 55.12,78.74 62.99,106.3
  rectangle: 74.8,78.74 82.68,106.3
  rectangle: 94.49,78.74 102.36,106.3
  rectangle: 114.17,78.74 122.05,106.3
  rectangle: 133.86,78.74 141.73,106.3
  rectangle: 153.54,78.74 161.42,106.3
  rectangle: 173.23,78.74 181.1,106.3
  rectangle: 192.91,78.74 200.79,106.3
  rectangle: 212.6,78.74 220.47,106.3
  lines w4: -312.99,74.8 -312.99,27.56 -342.52,27.56 -342.52,35.43 -320.87,35.43 -318.9,37.4 -318.9,57.09 -342.52,57.09 -342.52,64.96 -318.9,64.96 -318.9,76.77 -312.99,76.77 ; 312.99,74.8 312.99,27.56 342.52,27.56 342.52,35.43 320.87,35.43 318.9,37.4 318.9,57.09 342.52,57.09 342.52,64.96 318.9,64.96 318.9,76.77 312.99,76.77
  lines w8: -307.09,-55.12 -307.09,74.8 307.09,74.8 307.09,-55.12

## 52745-2490 [mil]
pads (24):
  rect 11.81x31.5 smd: 1(-226.38,98.43) 2(-206.69,98.43) 3(-187.01,98.43) 4(-167.32,98.43) 5(-147.64,98.43) 6(-127.95,98.43) 7(-108.27,98.43) 8(-88.58,98.43) 9(-68.9,98.43) 10(-49.21,98.43) 11(-29.53,98.43) 12(-9.84,98.43) 13(9.84,98.43) 14(29.53,98.43) 15(49.21,98.43) 16(68.9,98.43) 17(88.58,98.43) 18(108.27,98.43) 19(127.95,98.43) 20(147.64,98.43) 21(167.32,98.43) 22(187.01,98.43) 23(206.69,98.43) 24(226.38,98.43)
Top Layer:
  rectangle: -370.08,-7.87 -275.59,78.74
  rectangle: -326.77,-41.34 -275.59,-7.87
  rectangle: 275.59,-41.34 326.77,-7.87
  rectangle: 275.59,-7.87 370.08,78.74
Top Overlay:
  region: 0,0 10,0 10,10 0,10
  lines w4: -238.19,-122.05 -238.19,-137.8 -228.35,-127.95 -228.35,-122.05 ; 228.35,-122.05 228.35,-127.95 238.19,-137.8 238.19,-122.05
  lines w8: -316.93,-55.12 316.93,-55.12 ; -295.28,-114.17 -295.28,-59.06 ; -261.81,-49.21 -261.81,39.37 cw(c-258.86,39.37) -255.91,39.37 -255.91,-49.21 ; 255.91,-49.21 255.91,39.37 cw(c258.86,39.37) 261.81,39.37 261.81,-49.21 ; 295.28,-114.17 295.28,-59.06 ; -352.36,-137.8 -352.36,-118.11 352.36,-118.11 352.36,-137.8 348.43,-141.73 -348.43,-141.73 -352.36,-137.8
Top Paste:
  region: 362.2,72.83 283.46,72.83 283.46,-1.97 362.2,-1.97
  rectangle: -362.2,-1.97 -283.46,72.83
Top Solder:
  region: 370.08,78.74 324.8,78.74 324.8,-7.87 370.08,-7.87
  region: 326.77,78.74 275.59,78.74 275.59,-41.34 326.77,-41.34
  rectangle: -370.08,-7.87 -324.8,78.74
  rectangle: -326.77,-41.34 -275.59,78.74
Mechanical 16:
  rectangle: -230.32,78.74 -222.44,106.3
  rectangle: -210.63,78.74 -202.76,106.3
  rectangle: -190.94,78.74 -183.07,106.3
  rectangle: -171.26,78.74 -163.39,106.3
  rectangle: -151.57,78.74 -143.7,106.3
  rectangle: -131.89,78.74 -124.02,106.3
  rectangle: -112.2,78.74 -104.33,106.3
  rectangle: -92.52,78.74 -84.65,106.3
  rectangle: -72.83,78.74 -64.96,106.3
  rectangle: -53.15,78.74 -45.28,106.3
  rectangle: -33.46,78.74 -25.59,106.3
  rectangle: -13.78,78.74 -5.91,106.3
  rectangle: 5.91,78.74 13.78,106.3
  rectangle: 25.59,78.74 33.46,106.3
  rectangle: 45.28,78.74 53.15,106.3
  rectangle: 64.96,78.74 72.83,106.3
  rectangle: 84.65,78.74 92.52,106.3
  rectangle: 104.33,78.74 112.2,106.3
  rectangle: 124.02,78.74 131.89,106.3
  rectangle: 143.7,78.74 151.57,106.3
  rectangle: 163.39,78.74 171.26,106.3
  rectangle: 183.07,78.74 190.94,106.3
  rectangle: 202.76,78.74 210.63,106.3
  rectangle: 222.44,78.74 230.32,106.3
  lines w4: -322.83,74.8 -322.83,27.56 -352.36,27.56 -352.36,35.43 -330.71,35.43 -328.74,37.4 -328.74,57.09 -352.36,57.09 -352.36,64.96 -328.74,64.96 -328.74,76.77 -322.83,76.77 ; 322.83,74.8 322.83,27.56 352.36,27.56 352.36,35.43 330.71,35.43 328.74,37.4 328.74,57.09 352.36,57.09 352.36,64.96 328.74,64.96 328.74,76.77 322.83,76.77
  lines w8: -316.93,-55.12 -316.93,74.8 316.93,74.8 316.93,-55.12

## 52745-2590 [mil]
pads (25):
  rect 11.81x31.5 smd: 1(-236.22,98.43) 2(-216.54,98.43) 3(-196.85,98.43) 4(-177.17,98.43) 5(-157.48,98.43) 6(-137.8,98.43) 7(-118.11,98.43) 8(-98.43,98.43) 9(-78.74,98.43) 10(-59.06,98.43) 11(-39.37,98.43) 12(-19.69,98.43) 13(0,98.43) 14(19.69,98.43) 15(39.37,98.43) 16(59.06,98.43) 17(78.74,98.43) 18(98.43,98.43) 19(118.11,98.43) 20(137.8,98.43) 21(157.48,98.43) 22(177.17,98.43) 23(196.85,98.43) 24(216.54,98.43) 25(236.22,98.43)
Top Layer:
  rectangle: -379.92,-7.87 -285.43,78.74
  rectangle: -336.61,-41.34 -285.43,-7.87
  rectangle: 285.43,-41.34 336.61,-7.87
  rectangle: 285.43,-7.87 379.92,78.74
Top Overlay:
  region: 0,0 10,0 10,10 0,10
  lines w4: -248.03,-122.05 -248.03,-137.8 -238.19,-127.95 -238.19,-122.05 ; 238.19,-122.05 238.19,-127.95 248.03,-137.8 248.03,-122.05
  lines w8: -326.77,-55.12 326.77,-55.12 ; -305.12,-114.17 -305.12,-59.06 ; -271.65,-49.21 -271.65,39.37 cw(c-268.7,39.37) -265.75,39.37 -265.75,-49.21 ; 265.75,-49.21 265.75,39.37 cw(c268.7,39.37) 271.65,39.37 271.65,-49.21 ; 305.12,-114.17 305.12,-59.06 ; -362.2,-137.8 -362.2,-118.11 362.2,-118.11 362.2,-137.8 358.27,-141.73 -358.27,-141.73 -362.2,-137.8
Top Paste:
  region: 372.05,72.83 293.31,72.83 293.31,-1.97 372.05,-1.97
  rectangle: -372.05,-1.97 -293.31,72.83
Top Solder:
  region: 379.92,78.74 334.65,78.74 334.65,-7.87 379.92,-7.87
  region: 336.61,78.74 285.43,78.74 285.43,-41.34 336.61,-41.34
  rectangle: -379.92,-7.87 -334.65,78.74
  rectangle: -336.61,-41.34 -285.43,78.74
Mechanical 16:
  rectangle: -240.16,78.74 -232.28,106.3
  rectangle: -220.47,78.74 -212.6,106.3
  rectangle: -200.79,78.74 -192.91,106.3
  rectangle: -181.1,78.74 -173.23,106.3
  rectangle: -161.42,78.74 -153.54,106.3
  rectangle: -141.73,78.74 -133.86,106.3
  rectangle: -122.05,78.74 -114.17,106.3
  rectangle: -102.36,78.74 -94.49,106.3
  rectangle: -82.68,78.74 -74.8,106.3
  rectangle: -62.99,78.74 -55.12,106.3
  rectangle: -43.31,78.74 -35.43,106.3
  rectangle: -23.62,78.74 -15.75,106.3
  rectangle: -3.94,78.74 3.94,106.3
  rectangle: 15.75,78.74 23.62,106.3
  rectangle: 35.43,78.74 43.31,106.3
  rectangle: 55.12,78.74 62.99,106.3
  rectangle: 74.8,78.74 82.68,106.3
  rectangle: 94.49,78.74 102.36,106.3
  rectangle: 114.17,78.74 122.05,106.3
  rectangle: 133.86,78.74 141.73,106.3
  rectangle: 153.54,78.74 161.42,106.3
  rectangle: 173.23,78.74 181.1,106.3
  rectangle: 192.91,78.74 200.79,106.3
  rectangle: 212.6,78.74 220.47,106.3
  rectangle: 232.28,78.74 240.16,106.3
  lines w4: -332.68,74.8 -332.68,27.56 -362.2,27.56 -362.2,35.43 -340.55,35.43 -338.58,37.4 -338.58,57.09 -362.2,57.09 -362.2,64.96 -338.58,64.96 -338.58,76.77 -332.68,76.77 ; 332.68,74.8 332.68,27.56 362.2,27.56 362.2,35.43 340.55,35.43 338.58,37.4 338.58,57.09 362.2,57.09 362.2,64.96 338.58,64.96 338.58,76.77 332.68,76.77
  lines w8: -326.77,-55.12 -326.77,74.8 326.77,74.8 326.77,-55.12